# Altium footprint library 3.22-杂项.PcbLib: 199 footprints (part 6 of 15)
Each footprint in its own frame and in the unit in brackets; x right, y up, seen from the top. Pads: shape width x height; smd on the part's side, far side on the other; paste and mask are expansions set on the pad; w line width, h text height; cw(c..) or ccw(c..) is an arc to the next point about the centre after c.
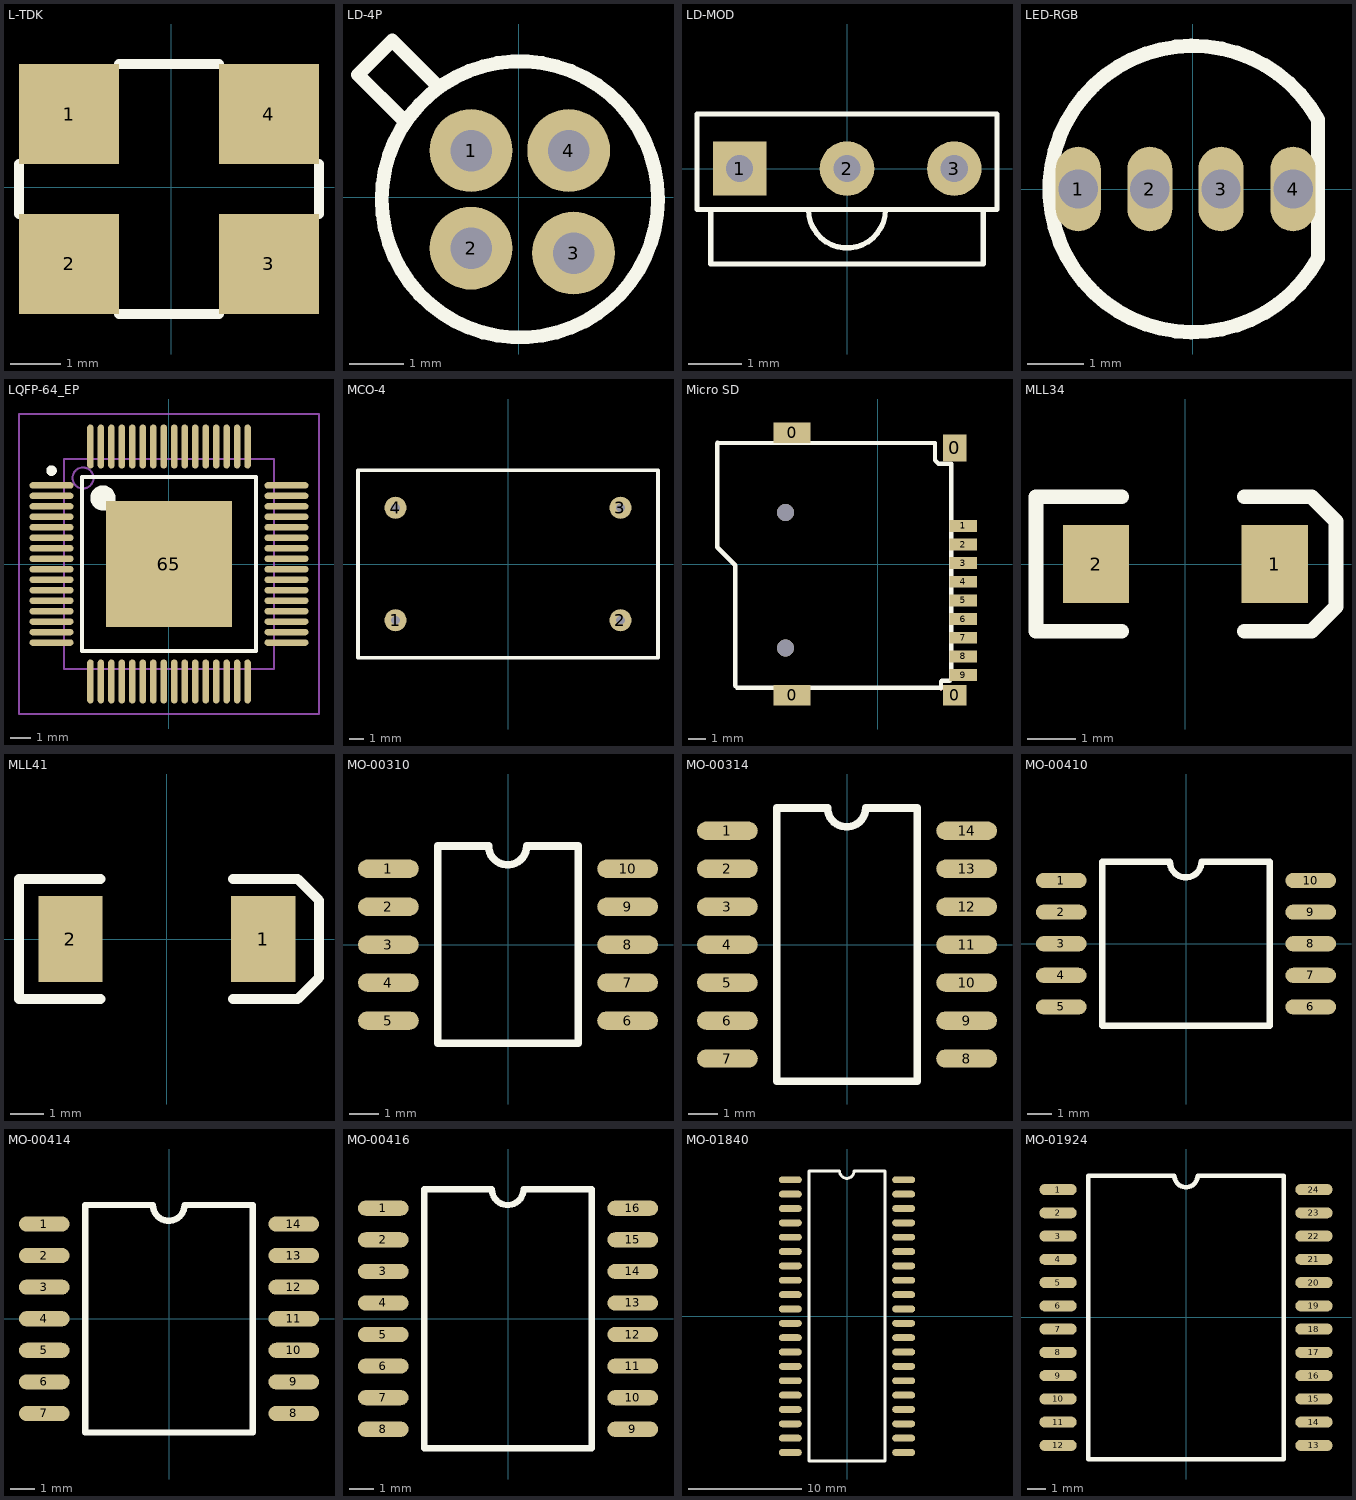
[diagram p5: the footprints below, top view; thin cyan lines are the x and y axes]

## L-TDK [mm]
height 10
pads (4):
  rect 2x2 smd: 1(-2.048,1.46) 2(-2.048,-1.54) 3(1.952,-1.54) 4(1.952,1.46)
Top Overlay:
  lines w0.2: -3.048,-0.54 -3.048,0.46 ; -1.048,-2.54 0.952,-2.54 ; -1.048,2.46 0.952,2.46 ; 2.952,-0.54 2.952,0.46

## LD-4P [mil]
pads (4):
  round 60 hole 30: 1(-34.71,33.93) 2(-34.71,-36.78) 3(39.54,-40.33) 4(35.98,33.92)
Top Overlay:
  circle w10: c0.64,-1.43 r100
  lines w9.84: -84.75,57.04 -116.57,88.86 -91.82,113.61 -60,81.79

## LD-MOD [mm] "激光"
height 5
pads (3):
  rect 1x1 hole 0.5: 1(-2,0)
  round 1.016 hole 0.5: 2(0,0)
  round 1.016 hole 0.508: 3(2,0)
Top Overlay:
  lines w0.1: -2.54,-0.762 -2.54,-1.778 2.54,-1.778 2.54,-0.762 ; -0.718,-0.762 ccw(c0,-0.762) 0.718,-0.762 ; -2.794,-0.762 -2.794,1.016 2.794,1.016 2.794,-0.762 -2.794,-0.762

## LED-RGB [mm] "三基色二极管"
height 6
pads (4):
  oval 0.8x1.5 hole 0.7: 1(-2.032,0) 2(-0.762,0) 3(0.5,0) 4(1.778,0)
Top Overlay:
  lines w0.254: 2.22,-1.234 cw(c0,0) 2.22,1.234 2.22,-1.234

## LQFP-64_EP [mm] "LQFP64"
height 1.5
pads (65):
  oval 2.1x0.3 smd: 1(-5.6,3.75) 2(-5.6,3.25) 3(-5.6,2.75) 4(-5.6,2.25) 5(-5.6,1.75) 6(-5.6,1.25) 7(-5.6,0.75) 8(-5.6,0.25) 9(-5.6,-0.25) 10(-5.6,-0.75) 11(-5.6,-1.25) 12(-5.6,-1.75) 13(-5.6,-2.25) 14(-5.6,-2.75) 15(-5.6,-3.25) 16(-5.6,-3.75) 33(5.6,-3.75) 34(5.6,-3.25) 35(5.6,-2.75) 36(5.6,-2.25) 37(5.6,-1.75) 38(5.6,-1.25) 39(5.6,-0.75) 40(5.6,-0.25) 41(5.6,0.25) 42(5.6,0.75) 43(5.6,1.25) 44(5.6,1.75) 45(5.6,2.25) 46(5.6,2.75) 47(5.6,3.25) 48(5.6,3.75)
  oval 0.3x2.1 smd: 17(-3.75,-5.6) 18(-3.25,-5.6) 19(-2.75,-5.6) 20(-2.25,-5.6) 21(-1.75,-5.6) 22(-1.25,-5.6) 23(-0.75,-5.6) 24(-0.25,-5.6) 25(0.25,-5.6) 26(0.75,-5.6) 27(1.25,-5.6) 28(1.75,-5.6) 29(2.25,-5.6) 30(2.75,-5.6) 31(3.25,-5.6) 32(3.75,-5.6) 49(3.75,5.6) 50(3.25,5.6) 51(2.75,5.6) 52(2.25,5.6) 53(1.75,5.6) 54(1.25,5.6) 55(0.75,5.6) 56(0.25,5.6) 57(-0.25,5.6) 58(-0.75,5.6) 59(-1.25,5.6) 60(-1.75,5.6) 61(-2.25,5.6) 62(-2.75,5.6) 63(-3.25,5.6) 64(-3.75,5.6)
  rect 6x6 smd: 65(0,0)
Top Overlay:
  circle w0.25: c-5.6,4.45 r0.125
  circle w0.6: c-3.15,3.15 r0.3
  lines w0.2: -4.15,-4.15 -4.15,4.15 4.15,4.15 4.15,-4.15 -4.15,-4.15
Mechanical 13:
  circle w0.1: c-4.1,4.1 r0.5
  lines w0.1: -5,-5 -5,5 5,5 5,-5 -5,-5
Mechanical 15:
  lines w0.1: -0.5,0 0.5,0 ; 0,-0.5 0,0.5 ; -7.15,-7.15 -7.15,7.15 7.15,7.15 7.15,-7.15 -7.15,-7.15
3D body: height 1.6, standoff 0, extent -5,-5 5,5

## MCO-4 [mm]
pads (4):
  round 1.5 hole 0.6: 1(-7.62,-3.81) 2(7.62,-3.81) 3(7.62,3.81) 4(-7.62,3.81)
Top Overlay:
  lines w0.254: -10.16,-6.35 -10.16,6.35 10.16,6.35 10.16,-6.35 -10.16,-6.35

## Micro SD [mm]
pads (13):
  rect 2.2x1.2 smd: 0(-5.05,-7.75) 0(-5.05,7.75)
  rect 1.4x1.2 smd: 0(4.55,-7.75)
  rect 1.4x1.6 smd: 0(4.55,6.85)
  rect 1.6x0.7 smd: 1(5.05,2.25) 2(5.05,1.15) 3(5.05,0.05) 4(5.05,-1.05) 5(5.05,-2.15) 6(5.05,-3.25) 7(5.05,-4.35) 8(5.05,-5.45) 9(5.05,-6.55)
via -5.45,-4.95 diameter 1 hole 1
via -5.45,3.05 diameter 1 hole 1
Top Layer:
  lines w0.254: 3.688,-7.293 3.738,-7.344
Top Overlay:
  lines w0.254: -9.47,7.13 -9.47,0.988 -8.403,-0.079 -8.403,-7.191 -8.301,-7.293 3.688,-7.293 ; -9.45,7.15 3.383,7.134 3.383,6.118 3.586,5.915 4.348,5.915 4.348,-6.785 4.246,-6.886 3.789,-6.886 3.738,-6.937 3.738,-7.344

## MLL34 [mil]
pads (2):
  rect 54x64 smd: 1(73,0) 2(-73,0)
Top Overlay:
  lines w12: -52,-55 -122,-55 -122,55 -52,55 ; 48,-55 103,-55 123,-35 123,35 103,55 48,55

## MLL41 [mil]
pads (2):
  rect 75x100 smd: 1(112.5,0) 2(-112.5,0)
Top Overlay:
  lines w12: -77.5,-70 -172.5,-70 -172.5,70 -77.5,70 ; 77.5,-70 152.5,-70 177.5,-45 177.5,45 152.5,70 77.5,70

## MO-00310 [mil]
pads (10):
  oval 80x24 smd: 1(-157.5,100) 2(-157.5,50) 3(-157.5,0) 4(-157.5,-50) 5(-157.5,-100) 6(157.5,-100) 7(157.5,-50) 8(157.5,0) 9(157.5,50) 10(157.5,100)
Top Overlay:
  lines w10: -92.5,-130 -92.5,130 -25.5,130 ccw(c-0.5,130) 24.5,130 92.5,130 92.5,-130 -92.5,-130

## MO-00314 [mil]
pads (14):
  oval 80x24 smd: 1(-157.5,150) 2(-157.5,100) 3(-157.5,50) 4(-157.5,0) 5(-157.5,-50) 6(-157.5,-100) 7(-157.5,-150) 8(157.5,-150) 9(157.5,-100) 10(157.5,-50) 11(157.5,0) 12(157.5,50) 13(157.5,100) 14(157.5,150)
Top Overlay:
  lines w10: -92.5,-180 -92.5,180 -25.5,180 ccw(c-0.5,180) 24.5,180 92.5,180 92.5,-180 -92.5,-180

## MO-00410 [mil]
pads (10):
  oval 80x24 smd: 1(-197.5,100) 2(-197.5,50) 3(-197.5,0) 4(-197.5,-50) 5(-197.5,-100) 6(197.5,-100) 7(197.5,-50) 8(197.5,0) 9(197.5,50) 10(197.5,100)
Top Overlay:
  lines w10: -132.5,-130 132.5,-130 132.5,130 24.5,130 cw(c-0.5,130) -25.5,130 -132.5,130 -132.5,-130

## MO-00414 [mil]
pads (14):
  oval 80x24 smd: 1(-197.5,150) 2(-197.5,100) 3(-197.5,50) 4(-197.5,0) 5(-197.5,-50) 6(-197.5,-100) 7(-197.5,-150) 8(197.5,-150) 9(197.5,-100) 10(197.5,-50) 11(197.5,0) 12(197.5,50) 13(197.5,100) 14(197.5,150)
Top Overlay:
  lines w10: -132.5,-180 132.5,-180 132.5,180 24.5,180 cw(c-0.5,180) -25.5,180 -132.5,180 -132.5,-180

## MO-00416 [mil]
pads (16):
  oval 80x24 smd: 1(-197.5,175) 2(-197.5,125) 3(-197.5,75) 4(-197.5,25) 5(-197.5,-25) 6(-197.5,-75) 7(-197.5,-125) 8(-197.5,-175) 9(197.5,-175) 10(197.5,-125) 11(197.5,-75) 12(197.5,-25) 13(197.5,25) 14(197.5,75) 15(197.5,125) 16(197.5,175)
Top Overlay:
  lines w10: -132.5,-205 132.5,-205 132.5,205 24.5,205 cw(c-0.5,205) -25.5,205 -132.5,205 -132.5,-205

## MO-01840 [mil]
pads (40):
  oval 80x24 smd: 1(-197.5,475) 2(-197.5,425) 3(-197.5,375) 4(-197.5,325) 5(-197.5,275) 6(-197.5,225) 7(-197.5,175) 8(-197.5,125) 9(-197.5,75) 10(-197.5,25) 11(-197.5,-25) 12(-197.5,-75) 13(-197.5,-125) 14(-197.5,-175) 15(-197.5,-225) 16(-197.5,-275) 17(-197.5,-325) 18(-197.5,-375) 19(-197.5,-425) 20(-197.5,-475) 21(197.5,-475) 22(197.5,-425) 23(197.5,-375) 24(197.5,-325) 25(197.5,-275) 26(197.5,-225) 27(197.5,-175) 28(197.5,-125) 29(197.5,-75) 30(197.5,-25) 31(197.5,25) 32(197.5,75) 33(197.5,125) 34(197.5,175) 35(197.5,225) 36(197.5,275) 37(197.5,325) 38(197.5,375) 39(197.5,425) 40(197.5,475)
Top Overlay:
  lines w10: -132.5,-505 132.5,-505 132.5,505 24.5,505 cw(c-0.5,505) -25.5,505 -132.5,505 -132.5,-505

## MO-01924 [mil]
pads (24):
  oval 80x24 smd: 1(-275,275) 2(-275,225) 3(-275,175) 4(-275,125) 5(-275,75) 6(-275,25) 7(-275,-25) 8(-275,-75) 9(-275,-125) 10(-275,-175) 11(-275,-225) 12(-275,-275) 13(275,-275) 14(275,-225) 15(275,-175) 16(275,-125) 17(275,-75) 18(275,-25) 19(275,25) 20(275,75) 21(275,125) 22(275,175) 23(275,225) 24(275,275)
Top Overlay:
  lines w10: -210,-305 210,-305 210,305 25,305 cw(c0,305) -25,305 -210,305 -210,-305